# Altium footprint library con-samtec.PCBLIB: 805 footprints (part 1 of 55)
Each footprint in its own frame and in the unit in brackets; x right, y up, seen from the top. Pads: shape width x height; smd on the part's side, far side on the other; paste and mask are expansions set on the pad; w line width, h text height; cw(c..) or ccw(c..) is an arc to the next point about the centre after c.
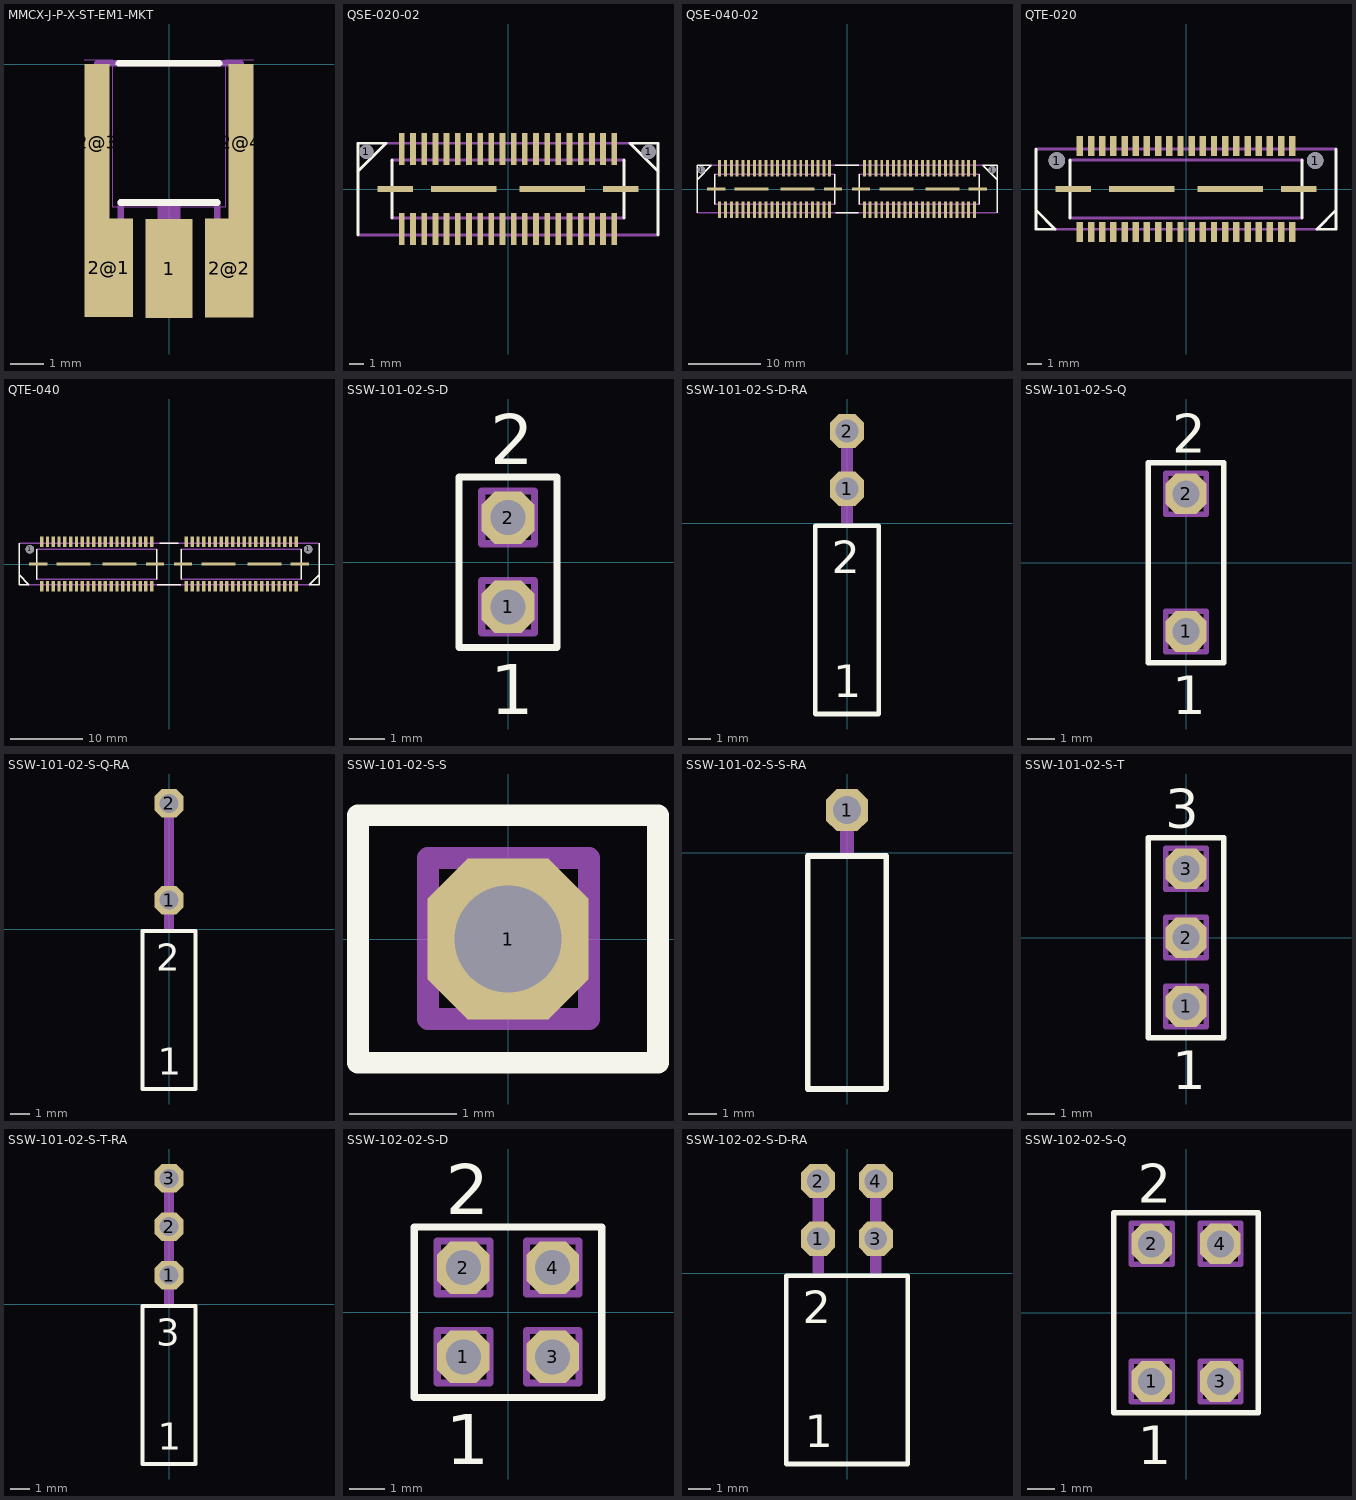
[diagram p0: the footprints below, top view; thin cyan lines are the x and y axes]

## MMCX-J-P-X-ST-EM1-MKT [mm]
pads (5):
  rect 1.4x2.975 smd: 1(0,-6.15)
  rect 1.46x2.975 smd: 2@1(-1.813,-6.125) 2@2(1.813,-6.137)
  rect 0.76x4.7 smd: 2@3(-2.163,-2.35) 2@4(2.163,-2.35)
Top Overlay:
  lines w0.203: -1.515,0.025 1.515,0.025 ; -1.45,-4.163 1.45,-4.163
Mechanical 1:
  lines w0: -2.55,0.125 -1.712,0.125 -1.712,-4.288 1.712,-4.288 1.712,0.125 2.55,0.125
Mechanical 16:
  rectangle: -0.35,-7.263 0.35,-4.237
  lines w0.203: -1.45,-4.163 -1.45,-7.163 -2.15,-7.163 -2.15,0.025 2.15,0.025 2.15,-7.163 1.45,-7.163 1.45,-4.163

## QSE-020-02 [mm]
pads (46):
  round 1.02 hole 1.02: 1(-10.13,2.67) 1(10.065,2.67)
  rect 0.41x2.27 smd: 1(-7.595,-2.86) 2(-7.595,2.87) 3(-6.795,-2.86) 4(-6.795,2.87) 5(-5.995,-2.86) 6(-5.995,2.87) 7(-5.195,-2.86) 8(-5.195,2.87) 9(-4.395,-2.86) 10(-4.395,2.87) 11(-3.595,-2.86) 12(-3.595,2.87) 13(-2.795,-2.86) 14(-2.795,2.87) 15(-1.995,-2.86) 16(-1.995,2.87) 17(-1.195,-2.86) 18(-1.195,2.87) 19(-0.395,-2.86) 20(-0.395,2.87) 21(0.405,-2.86) 22(0.405,2.87) 23(1.205,-2.86) 24(1.205,2.87) 25(2.005,-2.86) 26(2.005,2.87) 27(2.805,-2.86) 28(2.805,2.87) 29(3.605,-2.86) 30(3.605,2.87) 31(4.405,-2.86) 32(4.405,2.87) 33(5.205,-2.86) 34(5.205,2.87) 35(6.005,-2.86) 36(6.005,2.87) 37(6.805,-2.86) 38(6.805,2.87) 39(7.605,-2.86) 40(7.605,2.87)
  rect 2.54x0.43 smd: M1(-8.065,0) M2(8.065,0)
  rect 4.7x0.43 smd: M3(-3.175,0) M4(3.175,0)
Top Overlay:
  lines w0.203: -10.735,-3.275 -10.735,1.275 ; -8.3,-2.075 -8.3,2.075 ; 8.3,-2.075 8.3,2.075 ; 10.735,-3.275 10.735,1.275 ; -10.735,1.275 -10.735,3.275 -8.735,3.275 -10.735,1.275 ; 10.735,1.275 10.735,3.275 8.735,3.275 10.735,1.275
Mechanical 16:
  lines w0.203: -10.635,-3.275 10.635,-3.275 ; -8.735,3.275 8.735,3.275 ; -8.3,-2.075 8.3,-2.075 ; -8.3,2.075 8.3,2.075

## QSE-040-02 [mm]
pads (90):
  round 1.02 hole 1.02: 1(-20.13,2.67) 1(20.065,2.67)
  rect 0.41x2.27 smd: 1(-17.595,-2.86) 2(-17.595,2.87) 3(-16.795,-2.86) 4(-16.795,2.87) 5(-15.995,-2.86) 6(-15.995,2.87) 7(-15.195,-2.86) 8(-15.195,2.87) 9(-14.395,-2.86) 10(-14.395,2.87) 11(-13.595,-2.86) 12(-13.595,2.87) 13(-12.795,-2.86) 14(-12.795,2.87) 15(-11.995,-2.86) 16(-11.995,2.87) 17(-11.195,-2.86) 18(-11.195,2.87) 19(-10.395,-2.86) 20(-10.395,2.87) 21(-9.595,-2.86) 22(-9.595,2.87) 23(-8.795,-2.86) 24(-8.795,2.87) 25(-7.995,-2.86) 26(-7.995,2.87) 27(-7.195,-2.86) 28(-7.195,2.87) 29(-6.395,-2.86) 30(-6.395,2.87) 31(-5.595,-2.86) 32(-5.595,2.87) 33(-4.795,-2.86) 34(-4.795,2.87) 35(-3.995,-2.86) 36(-3.995,2.87) 37(-3.195,-2.86) 38(-3.195,2.87) 39(-2.395,-2.86) 40(-2.395,2.87) 41(2.405,-2.86) 42(2.405,2.87) 43(3.205,-2.86) 44(3.205,2.87) 45(4.005,-2.86) 46(4.005,2.87) 47(4.805,-2.86) 48(4.805,2.87) 49(5.605,-2.86) 50(5.605,2.87) 51(6.405,-2.86) 52(6.405,2.87) 53(7.205,-2.86) 54(7.205,2.87) 55(8.005,-2.86) 56(8.005,2.87) 57(8.805,-2.86) 58(8.805,2.87) 59(9.605,-2.86) 60(9.605,2.87) 61(10.405,-2.86) 62(10.405,2.87) 63(11.205,-2.86) 64(11.205,2.87) 65(12.005,-2.86) 66(12.005,2.87) 67(12.805,-2.86) 68(12.805,2.87) 69(13.605,-2.86) 70(13.605,2.87) 71(14.405,-2.86) 72(14.405,2.87) 73(15.205,-2.86) 74(15.205,2.87) 75(16.005,-2.86) 76(16.005,2.87) 77(16.805,-2.86) 78(16.805,2.87) 79(17.605,-2.86) 80(17.605,2.87)
  rect 2.54x0.43 smd: M1(-18.065,0) M2(-1.935,0) M5(1.935,0) M6(18.065,0)
  rect 4.7x0.43 smd: M3(-13.175,0) M4(-6.825,0) M7(6.825,0) M8(13.175,0)
Top Overlay:
  lines w0.203: -20.735,-3.275 -20.735,1.275 ; -18.3,-2.075 -18.3,2.075 ; -1.7,-2.075 -1.7,2.075 ; -1.59,3.275 1.59,3.275 ; -1.585,-3.275 1.585,-3.275 ; 1.7,-2.075 1.7,2.075 ; 18.3,-2.075 18.3,2.075 ; 20.735,-3.275 20.735,1.275 ; -20.735,1.275 -20.735,3.275 -18.735,3.275 -20.735,1.275 ; 20.735,1.275 20.735,3.275 18.735,3.275 20.735,1.275
Mechanical 16:
  lines w0.203: -20.635,-3.275 20.635,-3.275 ; -18.735,3.275 18.735,3.275 ; -18.3,-2.075 -1.7,-2.075 ; -18.3,2.075 -1.7,2.075 ; 1.7,-2.075 18.3,-2.075 ; 1.7,2.075 18.3,2.075

## QTE-020 [mm]
pads (46):
  round 1.19 hole 1.19: 1(-9.24,2.04) 1(9.24,2.04)
  rect 0.46x1.45 smd: 1(-7.595,3.09) 2(-7.595,-3.08) 3(-6.795,3.09) 4(-6.795,-3.08) 5(-5.995,3.09) 6(-5.995,-3.08) 7(-5.195,3.09) 8(-5.195,-3.08) 9(-4.395,3.09) 10(-4.395,-3.08) 11(-3.595,3.09) 12(-3.595,-3.08) 13(-2.795,3.09) 14(-2.795,-3.08) 15(-1.995,3.09) 16(-1.995,-3.08) 17(-1.195,3.09) 18(-1.195,-3.08) 19(-0.395,3.09) 20(-0.395,-3.08) 21(0.405,3.09) 22(0.405,-3.08) 23(1.205,3.09) 24(1.205,-3.08) 25(2.005,3.09) 26(2.005,-3.08) 27(2.805,3.09) 28(2.805,-3.08) 29(3.605,3.09) 30(3.605,-3.08) 31(4.405,3.09) 32(4.405,-3.08) 33(5.205,3.09) 34(5.205,-3.08) 35(6.005,3.09) 36(6.005,-3.08) 37(6.805,3.09) 38(6.805,-3.08) 39(7.605,3.09) 40(7.605,-3.08)
  rect 2.54x0.43 smd: M1(-8.065,0) M2(8.065,0)
  rect 4.7x0.43 smd: M3(-3.175,0) M4(3.175,0)
Top Overlay:
  lines w0.203: -10.735,2.875 -10.735,-1.51 ; -8.3,-2.075 -8.3,2.075 ; 8.3,-2.075 8.3,2.075 ; 10.735,2.875 10.735,-1.51 ; -10.735,-1.51 -10.735,-2.875 -9.37,-2.875 -10.735,-1.51 ; 10.735,-1.51 10.735,-2.875 9.37,-2.875 10.735,-1.51
Mechanical 16:
  lines w0.203: -10.635,2.875 10.635,2.875 ; -9.37,-2.875 9.37,-2.875 ; -8.3,-2.075 8.3,-2.075 ; -8.3,2.075 8.3,2.075

## QTE-040 [mm]
pads (90):
  round 1.19 hole 1.19: 1(-19.24,2.04) 1(19.24,2.04)
  rect 0.46x1.45 smd: 1(-17.595,3.09) 2(-17.595,-3.08) 3(-16.795,3.09) 4(-16.795,-3.08) 5(-15.995,3.09) 6(-15.995,-3.08) 7(-15.195,3.09) 8(-15.195,-3.08) 9(-14.395,3.09) 10(-14.395,-3.08) 11(-13.595,3.09) 12(-13.595,-3.08) 13(-12.795,3.09) 14(-12.795,-3.08) 15(-11.995,3.09) 16(-11.995,-3.08) 17(-11.195,3.09) 18(-11.195,-3.08) 19(-10.395,3.09) 20(-10.395,-3.08) 21(-9.595,3.09) 22(-9.595,-3.08) 23(-8.795,3.09) 24(-8.795,-3.08) 25(-7.995,3.09) 26(-7.995,-3.08) 27(-7.195,3.09) 28(-7.195,-3.08) 29(-6.395,3.09) 30(-6.395,-3.08) 31(-5.595,3.09) 32(-5.595,-3.08) 33(-4.795,3.09) 34(-4.795,-3.08) 35(-3.995,3.09) 36(-3.995,-3.08) 37(-3.195,3.09) 38(-3.195,-3.08) 39(-2.395,3.09) 40(-2.395,-3.08) 41(2.405,3.09) 42(2.405,-3.08) 43(3.205,3.09) 44(3.205,-3.08) 45(4.005,3.09) 46(4.005,-3.08) 47(4.805,3.09) 48(4.805,-3.08) 49(5.605,3.09) 50(5.605,-3.08) 51(6.405,3.09) 52(6.405,-3.08) 53(7.205,3.09) 54(7.205,-3.08) 55(8.005,3.09) 56(8.005,-3.08) 57(8.805,3.09) 58(8.805,-3.08) 59(9.605,3.09) 60(9.605,-3.08) 61(10.405,3.09) 62(10.405,-3.08) 63(11.205,3.09) 64(11.205,-3.08) 65(12.005,3.09) 66(12.005,-3.08) 67(12.805,3.09) 68(12.805,-3.08) 69(13.605,3.09) 70(13.605,-3.08) 71(14.405,3.09) 72(14.405,-3.08) 73(15.205,3.09) 74(15.205,-3.08) 75(16.005,3.09) 76(16.005,-3.08) 77(16.805,3.09) 78(16.805,-3.08) 79(17.605,3.09) 80(17.605,-3.08)
  rect 2.54x0.43 smd: M1(-18.065,0) M2(-1.935,0) M5(1.935,0) M6(18.065,0)
  rect 4.7x0.43 smd: M3(-13.175,0) M4(-6.825,0) M7(6.825,0) M8(13.175,0)
Top Overlay:
  lines w0.203: -20.735,2.875 -20.735,-1.51 ; -18.3,-2.075 -18.3,2.075 ; -1.7,-2.075 -1.7,2.075 ; -1.6,-2.875 1.6,-2.875 ; -1.3,2.875 1.3,2.875 ; 1.7,-2.075 1.7,2.075 ; 18.3,-2.075 18.3,2.075 ; 20.735,2.875 20.735,-1.51 ; -20.735,-1.51 -20.735,-2.875 -19.37,-2.875 -20.735,-1.51 ; 20.735,-1.51 20.735,-2.875 19.37,-2.875 20.735,-1.51
Mechanical 16:
  lines w0.203: -20.635,2.875 20.635,2.875 ; -19.37,-2.875 19.37,-2.875 ; -18.3,-2.075 -1.7,-2.075 ; -18.3,2.075 -1.7,2.075 ; 1.7,-2.075 18.3,-2.075 ; 1.7,2.075 18.3,2.075

## SSW-101-02-S-D [mm]
pads (2):
  oct 1.5x1.5 hole 1: 1(0,-1.27) 2(0,1.27)
Top Overlay:
  lines w0.203: -1.399,-2.425 1.399,-2.425 1.399,2.425 -1.399,2.425 -1.399,-2.425
  text "1" at -0.508,-4.318 h1.42
  text "2" at -0.508,2.794 h1.42
Mechanical 16:
  lines w0.203: -0.745,-2.015 0.755,-2.015 0.755,-0.515 -0.745,-0.515 -0.745,-2.015 ; -0.745,0.525 0.755,0.525 0.755,2.025 -0.745,2.025 -0.745,0.525

## SSW-101-02-S-D-RA [mil]
pads (2):
  oct 59.06x59.06 hole 39.37: 1(0,60) 2(0,160)
Top Overlay:
  lines w8: -55.08,-330.55 55.08,-330.55 55.08,-4.17 -55.08,-4.17 -55.08,-330.55
  text "1" at -23.43,-301.18 h56.1
  text "2" at -26.38,-86.61 h56.1
Mechanical 16:
  rectangle: -10,0 10,170

## SSW-101-02-S-Q [mm]
pads (2):
  oct 1.5x1.5 hole 1: 1(0,-2.54) 2(0,2.54)
Top Overlay:
  lines w0.203: -1.399,-3.695 1.399,-3.695 1.399,3.695 -1.399,3.695 -1.399,-3.695
  text "1" at -0.508,-5.588 h1.42
  text "2" at -0.508,4.064 h1.42
Mechanical 16:
  lines w0.203: -0.745,-3.285 0.755,-3.285 0.755,-1.785 -0.745,-1.785 -0.745,-3.285 ; -0.745,1.795 0.755,1.795 0.755,3.295 -0.745,3.295 -0.745,1.795

## SSW-101-02-S-Q-RA [mil]
pads (2):
  oct 59.06x59.06 hole 39.37: 1(0,60) 2(0,260)
Top Overlay:
  lines w8: -55.08,-330.55 55.08,-330.55 55.08,-4.17 -55.08,-4.17 -55.08,-330.55
  text "1" at -23.43,-301.18 h56.1
  text "2" at -26.38,-86.61 h56.1
Mechanical 16:
  rectangle: -10,0 10,270

## SSW-101-02-S-S [mm]
pads (1):
  oct 1.5x1.5 hole 1: 1(0,0)
Top Overlay:
  lines w0.203: -1.399,-1.155 1.399,-1.155 1.399,1.155 -1.399,1.155 -1.399,-1.155
Mechanical 16:
  lines w0.203: -0.745,-0.745 0.755,-0.745 0.755,0.755 -0.745,0.755 -0.745,-0.745

## SSW-101-02-S-S-RA [mil]
pads (1):
  oct 59.06x59.06 hole 39.37: 1(0,60)
Top Overlay:
  lines w8: -55.08,-330.55 55.08,-330.55 55.08,-4.17 -55.08,-4.17 -55.08,-330.55
Mechanical 16:
  rectangle: -10,0 10,70

## SSW-101-02-S-T [mm]
pads (3):
  oct 1.5x1.5 hole 1: 1(0,-2.54) 2(0,0) 3(0,2.54)
Top Overlay:
  lines w0.203: -1.399,-3.695 1.399,-3.695 1.399,3.695 -1.399,3.695 -1.399,-3.695
  text "1" at -0.508,-5.588 h1.42
  text "3" at -0.762,4.064 h1.42
Mechanical 16:
  lines w0.203: -0.745,-3.285 0.755,-3.285 0.755,-1.785 -0.745,-1.785 -0.745,-3.285 ; -0.745,-0.745 0.755,-0.745 0.755,0.755 -0.745,0.755 -0.745,-0.745 ; -0.745,1.795 0.755,1.795 0.755,3.295 -0.745,3.295 -0.745,1.795

## SSW-101-02-S-T-RA [mil]
pads (3):
  oct 59.06x59.06 hole 39.37: 1(0,60) 2(0,160) 3(0,260)
Top Overlay:
  lines w8: -55.08,-330.55 55.08,-330.55 55.08,-4.17 -55.08,-4.17 -55.08,-330.55
  text "1" at -23.43,-301.18 h56.1
  text "3" at -26.38,-86.61 h56.1
Mechanical 16:
  rectangle: -10,0 10,270

## SSW-102-02-S-D [mm]
pads (4):
  oct 1.5x1.5 hole 1: 1(-1.27,-1.27) 2(-1.27,1.27) 3(1.27,-1.27) 4(1.27,1.27)
Top Overlay:
  lines w0.203: -2.669,-2.425 2.669,-2.425 2.669,2.425 -2.669,2.425 -2.669,-2.425
  text "1" at -1.778,-4.318 h1.42
  text "2" at -1.778,2.794 h1.42
Mechanical 16:
  lines w0.203: -2.015,-2.015 -0.515,-2.015 -0.515,-0.515 -2.015,-0.515 -2.015,-2.015 ; -2.015,0.525 -0.515,0.525 -0.515,2.025 -2.015,2.025 -2.015,0.525 ; 0.525,-2.015 2.025,-2.015 2.025,-0.515 0.525,-0.515 0.525,-2.015 ; 0.525,0.525 2.025,0.525 2.025,2.025 0.525,2.025 0.525,0.525

## SSW-102-02-S-D-RA [mil]
pads (4):
  oct 59.06x59.06 hole 39.37: 1(-50,60) 2(-50,160) 3(50,60) 4(50,160)
Top Overlay:
  lines w8: -105.08,-330.55 105.08,-330.55 105.08,-4.17 -105.08,-4.17 -105.08,-330.55
  text "1" at -73.43,-301.18 h56.1
  text "2" at -76.38,-86.61 h56.1
Mechanical 16:
  rectangle: -60,0 -40,170
  rectangle: 40,0 60,170

## SSW-102-02-S-Q [mm]
pads (4):
  oct 1.5x1.5 hole 1: 1(-1.27,-2.54) 2(-1.27,2.54) 3(1.27,-2.54) 4(1.27,2.54)
Top Overlay:
  lines w0.203: -2.669,-3.695 2.669,-3.695 2.669,3.695 -2.669,3.695 -2.669,-3.695
  text "1" at -1.778,-5.588 h1.42
  text "2" at -1.778,4.064 h1.42
Mechanical 16:
  lines w0.203: -2.015,-3.285 -0.515,-3.285 -0.515,-1.785 -2.015,-1.785 -2.015,-3.285 ; -2.015,1.795 -0.515,1.795 -0.515,3.295 -2.015,3.295 -2.015,1.795 ; 0.525,-3.285 2.025,-3.285 2.025,-1.785 0.525,-1.785 0.525,-3.285 ; 0.525,1.795 2.025,1.795 2.025,3.295 0.525,3.295 0.525,1.795